# Altium footprint library Hydrolib_pcb.PcbLib: 97 footprints (part 1 of 7)
Each footprint in its own frame and in the unit in brackets; x right, y up, seen from the top. Pads: shape width x height; smd on the part's side, far side on the other; paste and mask are expansions set on the pad; w line width, h text height; cw(c..) or ccw(c..) is an arc to the next point about the centre after c.
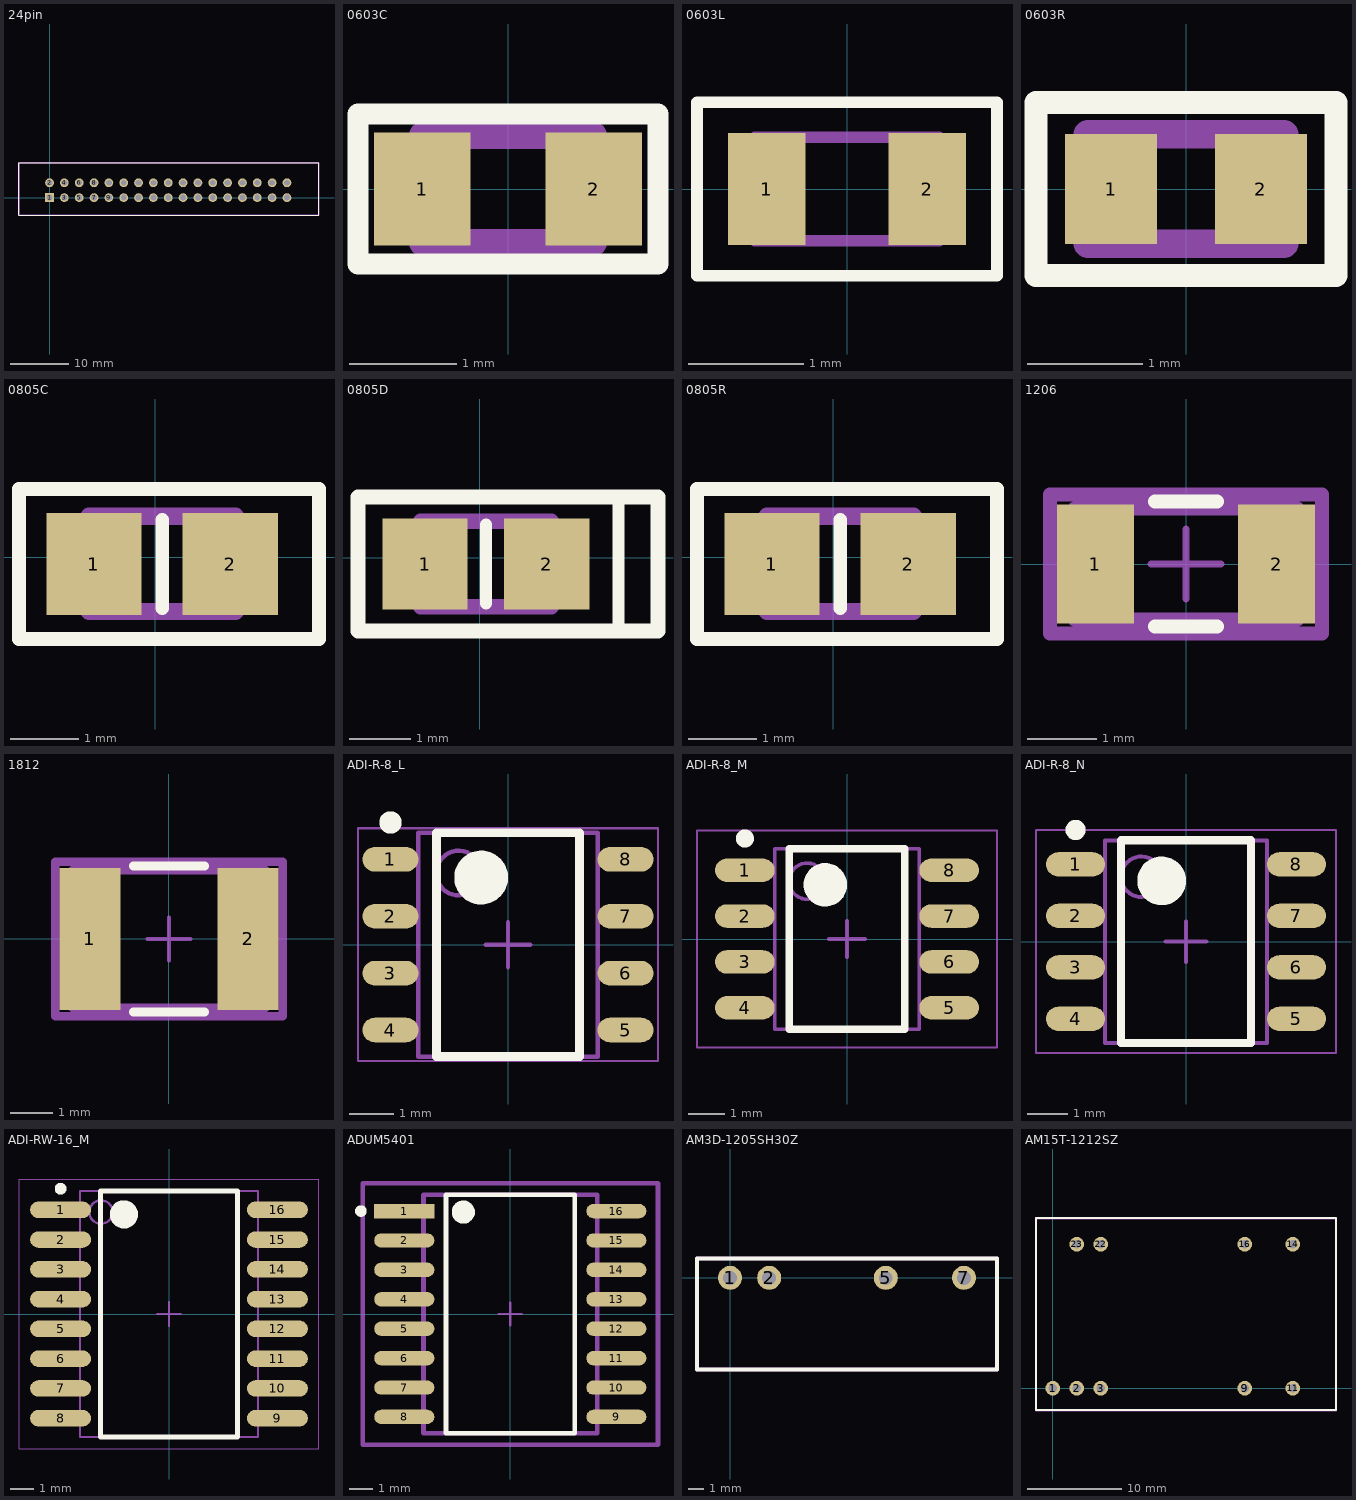
[diagram p0: the footprints below, top view; thin cyan lines are the x and y axes]

## 24pin [mm]
pads (34):
  rect 1.5x1.5 hole 1: 1(0,0)
  round 1.5 hole 1: 2(0,2.54) 3(2.54,0) 4(2.54,2.54) 5(5.08,0) 6(5.08,2.54) 7(7.62,0) 8(7.62,2.54) 9(10.16,0) 10(10.16,2.54) 11(12.7,0) 12(12.7,2.54) 13(15.24,0) 14(15.24,2.54) 15(17.78,0) 16(17.78,2.54) 17(20.32,0) 18(20.32,2.54) 19(22.86,0) 20(22.86,2.54) 21(25.4,0) 22(25.4,2.54) 23(27.94,0) 24(27.94,2.54) 25(30.48,0) 26(30.48,2.54) 27(33.02,0) 28(33.02,2.54) 29(35.56,0) 30(35.56,2.54) 31(38.1,0) 32(38.1,2.54) 33(40.64,0) 34(40.64,2.54)
Top Overlay:
  lines w0.2: -5.201,6 -5.224,5.977 -5.224,-3.017 46.076,-3.017 46.11,-2.982 46.11,6 46.109,6.001 -5.2,6.001
Bottom Overlay:
  lines w0.2: -5.214,-2.989 -5.2,-2.975 ; -5.2,6 -5.2,6.001 46.052,6.001 46.126,5.926 46.126,-3.004 -5.171,-3.004
  lines w0.254: -5.2,-2.975 -5.2,6.001
Pattern top:
  lines w0.25: -5.224,6 -5.224,-3.017 46.076,-3.017 ; -5.108,6.001 46.05,6.001 ; 46.11,-3.047 46.11,6
  lines w0.254: -5.2,-3 -5.2,-0.5
  text ".Designator" at 15.1,3.2 h2.15
3D body "BH-34.STEP": height 9, standoff -3.1, extent -5.044,-3.154 45.736,5.846

## 0603C [mm] "Chip Resistor, 2-Leads, Body 1,40x0,80mm, IPC Medium Density"
height 0.9
pads (2):
  rect 0.9x1.05 smd: 1(-0.8,0) 2(0.8,0)
Top Overlay:
  lines w0.2: -1.4,-0.7 1.4,-0.7 1.4,0.7 -1.4,0.7 -1.4,-0.7
Pattern top:
  lines w0.25: -0.8,-0.5 0.8,-0.5 0.8,0.5 -0.8,0.5 -0.8,-0.5
  text ".Designator" at -2.2,1.4 h2.15
3D body "CAPC-0603-T0.9-BN.stp": height 0.9, standoff 0, extent -0.85,-0.45 0.85,0.45

## 0603L [mm] "Chip Inductor, 2-Leads, Body 1,55x0,85mm, IPC Medium Density"
height 0.45
pads (2):
  rect 0.67x0.97 smd: 1(-0.695,0) 2(0.695,0)
Top Overlay:
  lines w0.1: -1.3,-0.75 -1.3,0.75 1.3,0.75 1.3,-0.75 -1.3,-0.75
Pattern top:
  lines w0.1: -0.8,-0.45 0.8,-0.45 ; -0.8,0.45 0.8,0.45
  text ".Designator" at -1.85,1.075 h2.15
Mechanical 13:
  lines w0.1: -0.8,-0.45 -0.8,0.45 ; 0.8,-0.45 0.8,0.45
3D body "0603L.step": height 0.45, standoff 0, extent -0.8,-0.45 0.8,0.45

## 0603R [mm] "Chip Resistor, 2-Leads, Body 1.60x0.85mm, IPC Medium Density"
height 0.5
pads (2):
  rect 0.8x0.95 smd: 1(-0.65,0) 2(0.65,0)
Top Overlay:
  lines w0.2: -1.3,-0.75 -1.3,0.75 1.3,0.75 1.3,-0.75 -1.3,-0.75
Pattern top:
  lines w0.25: -0.85,-0.475 -0.85,0.475 0.85,0.475 0.85,-0.475 -0.85,-0.475
  text ".Designator" at -2.4,1.4 h2.15
3D body "NTC-0603-T0.9.stp": height 0.9, standoff 0, extent -0.875,-0.475 0.875,0.475

## 0805C [mm]
pads (2):
  rect 1.4x1.5 smd: 1(-0.9,-0.1) 2(1.1,-0.1)
Top Overlay:
  lines w0.2: 0.1,-0.75 0.1,0.55 ; -2,-1.2 -2,1 2.4,1 2.4,-1.2 -2,-1.2
Pattern top:
  lines w0.25: -0.975,-0.8 1.175,-0.8 1.175,0.6 -0.975,0.6 -0.975,-0.8
  text ".Designator" at -3.4,1.6 h2.15
3D body "CAPC-0805-T1.35-BN.stp": height 0.67, standoff -0.67, extent -0.95,-0.8 1.15,0.55

## 0805D [mm]
pads (2):
  rect 1.4x1.5 smd: 1(-0.9,-0.1) 2(1.1,-0.1)
Top Overlay:
  lines w0.2: 0.1,-0.75 0.1,0.55 ; 2.275,1 2.275,-1.15 2.325,-1.2 2.925,-1.2
  lines w0.254: -2,-1.2 2.925,-1.2 2.925,1 -2,1 -2,-1.2
Pattern top:
  lines w0.25: -0.975,-0.8 -0.975,0.6 1.175,0.6 1.175,-0.8 -0.975,-0.8
3D body: height 0.7, standoff 0, extent -0.975,-0.8 1.175,0.6

## 0805R [mm]
pads (2):
  rect 1.4x1.5 smd: 1(-0.9,-0.1) 2(1.1,-0.1)
Top Overlay:
  lines w0.2: 0.1,-0.75 0.1,0.55 ; -2,-1.2 -2,1 2.4,1 2.4,-1.2 -2,-1.2
Pattern top:
  lines w0.25: -0.975,-0.8 1.175,-0.8 1.175,0.6 -0.975,0.6 -0.975,-0.8
  text ".Designator" at -1.4,1.8 h2.15
3D body "User Library-Chip Resistor2.step": height 0.5, standoff 0, extent -0.9,-0.7 1.1,0.5

## 1206 [mm]
pads (2):
  rect 1.105x1.706 smd paste+0 mask+0: 1(-1.301,0) 2(1.301,0)
Top Overlay:
  lines w0.2: -0.448,-0.9 0.448,-0.9 ; -0.448,0.9 0.448,0.9
Pattern top:
  lines w0.2: -1.953,-1 1.953,-1 1.953,1 -1.953,1 -1.953,-1
  text ".Designator" at 0,0.188 h1
Top 3D Body:
  lines w0.2: -1.6,-0.8 1.6,-0.8 1.6,0.8 -1.6,0.8 -1.6,-0.8
Mechanical 15:
  lines w0.025: -1.953,-1 -1.953,1 1.953,1 1.953,-1 -1.953,-1
  lines w0.1: -0.5,0 0.5,0 ; 0,-0.5 0,0.5
3D body "Cap_AVX_12065A222JAT2A_eec.STEP": height 0.25, standoff 0, extent -1.953,-1 1.953,1

## 1812 [mm]
pads (2):
  rect 1.423x3.306 smd paste+0 mask+0: 1(-1.841,0) 2(1.841,0)
Top Overlay:
  lines w0.2: -0.829,-1.7 0.829,-1.7 ; -0.829,1.7 0.829,1.7
Pattern top:
  lines w0.2: -2.652,-1.8 -2.652,1.8 2.652,1.8 2.652,-1.8 -2.652,-1.8
  text ".Designator" at 0,0.188 h1
Top 3D Body:
  lines w0.2: -2.25,-1.6 2.25,-1.6 2.25,1.6 -2.25,1.6 -2.25,-1.6
Mechanical 15:
  lines w0.025: -2.652,-1.8 -2.652,1.8 2.652,1.8 2.652,-1.8 -2.652,-1.8
  lines w0.1: -0.5,0 0.5,0 ; 0,-0.5 0,0.5
3D body "Cap_AVX_18127A152JAT2A_eec.STEP": height 0.25, standoff 0, extent -2.652,-1.8 2.652,1.8

## ADI-R-8_L [mm] "SOIC, 8-Leads, Body 5x4mm, Pitch 1.27mm, IPC High Density"
height 1.75
pads (8):
  oval 1.25x0.55 smd: 1(-2.625,1.905) 2(-2.625,0.635) 3(-2.625,-0.635) 4(-2.625,-1.905) 5(2.625,-1.905) 6(2.625,-0.635) 7(2.625,0.635) 8(2.625,1.905)
Top Overlay:
  circle w0.25: c-2.625,2.73 r0.125
  circle w0.6: c-0.6,1.5 r0.3
  lines w0.2: -1.6,-2.5 -1.6,2.5 1.6,2.5 1.6,-2.5 -1.6,-2.5
Mechanical 13:
  circle w0.1: c-1.1,1.6 r0.5
  lines w0.1: -2,-2.5 -2,2.5 2,2.5 2,-2.5 -2,-2.5
Mechanical 15:
  lines w0.05: -3.35,-2.6 -3.35,2.6 3.35,2.6 3.35,-2.6 -3.35,-2.6
  lines w0.1: -0.5,0 0.5,0 ; 0,-0.5 0,0.5
3D body "SOIC127P600X175-8L.step": height 1.75, standoff 0, extent -3,-2.5 3,2.5

## ADI-R-8_M [mm] "SOIC, 8-Leads, Body 5x4mm, Pitch 1.27mm, IPC Low Density"
height 1.75
pads (8):
  oval 1.65x0.65 smd: 1(-2.825,1.905) 2(-2.825,0.635) 3(-2.825,-0.635) 4(-2.825,-1.905) 5(2.825,-1.905) 6(2.825,-0.635) 7(2.825,0.635) 8(2.825,1.905)
Top Overlay:
  circle w0.6: c-0.6,1.5 r0.3
  circle w0.25: c-2.825,2.78 r0.125
  lines w0.2: -1.6,-2.5 1.6,-2.5 1.6,2.5 -1.6,2.5 -1.6,-2.5
Mechanical 13:
  circle w0.1: c-1.1,1.6 r0.5
  lines w0.1: -2,-2.5 2,-2.5 2,2.5 -2,2.5 -2,-2.5
Mechanical 15:
  lines w0.05: -4.15,-3 4.15,-3 4.15,3 -4.15,3 -4.15,-3
  lines w0.1: -0.5,0 0.5,0 ; 0,-0.5 0,0.5
3D body "SOIC127P600X175-8M.step": height 1.75, standoff 0, extent -3,-2.5 3,2.5

## ADI-R-8_N [mm] "SOIC, 8-Leads, Body 5x4mm, Pitch 1.27mm, IPC Medium Density"
height 1.75
pads (8):
  oval 1.45x0.6 smd: 1(-2.725,1.905) 2(-2.725,0.635) 3(-2.725,-0.635) 4(-2.725,-1.905) 5(2.725,-1.905) 6(2.725,-0.635) 7(2.725,0.635) 8(2.725,1.905)
Top Overlay:
  circle w0.25: c-2.725,2.755 r0.125
  circle w0.6: c-0.6,1.5 r0.3
  lines w0.2: -1.6,-2.5 -1.6,2.5 1.6,2.5 1.6,-2.5 -1.6,-2.5
Mechanical 13:
  circle w0.1: c-1.1,1.6 r0.5
  lines w0.1: -2,-2.5 -2,2.5 2,2.5 2,-2.5 -2,-2.5
Mechanical 15:
  lines w0.05: -3.7,-2.75 -3.7,2.75 3.7,2.75 3.7,-2.75 -3.7,-2.75
  lines w0.1: -0.5,0 0.5,0 ; 0,-0.5 0,0.5
3D body "SOIC127P600X175-8N.step": height 1.75, standoff 0, extent -3,-2.5 3,2.5

## ADI-RW-16_M [mm] "SOIC, 16-Leads, Body 10.3x7.5mm, Pitch 1.27mm, IPC Low Density"
height 2.65
pads (16):
  oval 2.6x0.7 smd: 1(-4.625,4.445) 2(-4.625,3.175) 3(-4.625,1.905) 4(-4.625,0.635) 5(-4.625,-0.635) 6(-4.625,-1.905) 7(-4.625,-3.175) 8(-4.625,-4.445) 9(4.625,-4.445) 10(4.625,-3.175) 11(4.625,-1.905) 12(4.625,-0.635) 13(4.625,0.635) 14(4.625,1.905) 15(4.625,3.175) 16(4.625,4.445)
Top Overlay:
  circle w0.6: c-1.925,4.25 r0.3
  circle w0.25: c-4.625,5.345 r0.125
  lines w0.2: -2.925,-5.25 2.925,-5.25 2.925,5.25 -2.925,5.25 -2.925,-5.25
Mechanical 13:
  circle w0.1: c-2.9,4.35 r0.5
  lines w0.1: -3.8,-5.25 3.8,-5.25 3.8,5.25 -3.8,5.25 -3.8,-5.25
Mechanical 15:
  lines w0.05: -6.4,-5.75 6.4,-5.75 6.4,5.75 -6.4,5.75 -6.4,-5.75
  lines w0.1: -0.5,0 0.5,0 ; 0,-0.5 0,0.5
3D body: height 2.65, standoff 0.1, extent -3.8,-5.25 3.8,5.25

## ADUM5401 [mm]
pads (16):
  rect 2.598x0.622 smd paste+0 mask+0: 1(-4.578,4.445)
  rrect100% 2.598x0.622 smd paste+0 mask+0: 2(-4.578,3.175) 3(-4.578,1.905) 4(-4.578,0.635) 5(-4.578,-0.635) 6(-4.578,-1.905) 7(-4.578,-3.175) 8(-4.578,-4.445) 9(4.578,-4.445) 10(4.578,-3.175) 11(4.578,-1.905) 12(4.578,-0.635) 13(4.578,0.635) 14(4.578,1.905) 15(4.578,3.175) 16(4.578,4.445)
Top Overlay:
  circle w0.5: c-2.029,4.4 r0.25
  circle w0.25: c-6.452,4.445 r0.125
  lines w0.2: -2.779,-5.15 2.779,-5.15 2.779,5.15 -2.779,5.15 -2.779,-5.15
Template:
  lines w0.2: -6.377,-5.65 6.377,-5.65 6.377,5.65 -6.377,5.65 -6.377,-5.65
Top 3D Body:
  lines w0.2: -3.75,-5.15 3.75,-5.15 3.75,5.15 -3.75,5.15 -3.75,-5.15
Mechanical 15:
  lines w0.1: -0.5,0 0.5,0 ; 0,-0.5 0,0.5
Top Assembly:
  lines w0.2: -6.377,-5.65 6.377,-5.65 6.377,5.65 -6.377,5.65 -6.377,-5.65
  text ".Designator" at 0,0.188 h1
3D body "IC_Analog_Devices_ADM2486BRWZ_eec.STEP": height 2.65, standoff 0, extent -5.181,-5.15 5.181,5.15

## AM3D-1205SH30Z [mm]
height 9.5
pads (4):
  round 1.56 hole 0.9: 1(0,0) 2(2.54,0) 5(10.12,0) 7(15.2,0)
Top Overlay:
  lines w0.254: -2.15,-5.95 17.35,-5.95 17.35,1.25 -2.15,1.25 -2.15,-5.95
Pattern top:
  lines w0.254: -2.15,-5.95 -2.15,1.25 17.35,1.25 17.35,-5.95 -2.15,-5.95
  text ".Designator" at 3.8,-3.1 h2.15
3D body "DC-DC.STEP": height 9.5, standoff -3.55, extent -2.15,-5.9 17.35,1.3

## AM15T-1212SZ [mm]
pads (9):
  round 1.56 hole 0.9: 1(0,0) 2(2.54,0) 3(5.08,0) 9(20.32,0) 11(25.4,0) 14(25.4,15.24) 16(20.32,15.24) 22(5.08,15.24) 23(2.54,15.24)
Top Overlay:
  lines w0.2: 2.54,18.034 -1.778,18.034 ; -1.778,18.034 -1.778,-2.286 29.972,-2.286 29.972,18.034 -1.778,18.034
Pattern top:
  lines w0.25: 2.54,18 -1.778,18 ; -1.778,18 29.972,18 29.972,-2.32 -1.778,-2.32 -1.778,18
  text ".Designator" at 9.3,8.1 h2.15
3D body "AM15T-1212SZ(DC-DC преобр).STEP": height 11.16, standoff -2.05, extent -1.905,-2.54 29.845,17.78